# Altium footprint library Módulos y Tarjetas.PcbLib: 18 footprints (part 1 of 2)
Each footprint in its own frame and in the unit in brackets; x right, y up, seen from the top. Pads: shape width x height; smd on the part's side, far side on the other; paste and mask are expansions set on the pad; w line width, h text height; cw(c..) or ccw(c..) is an arc to the next point about the centre after c.
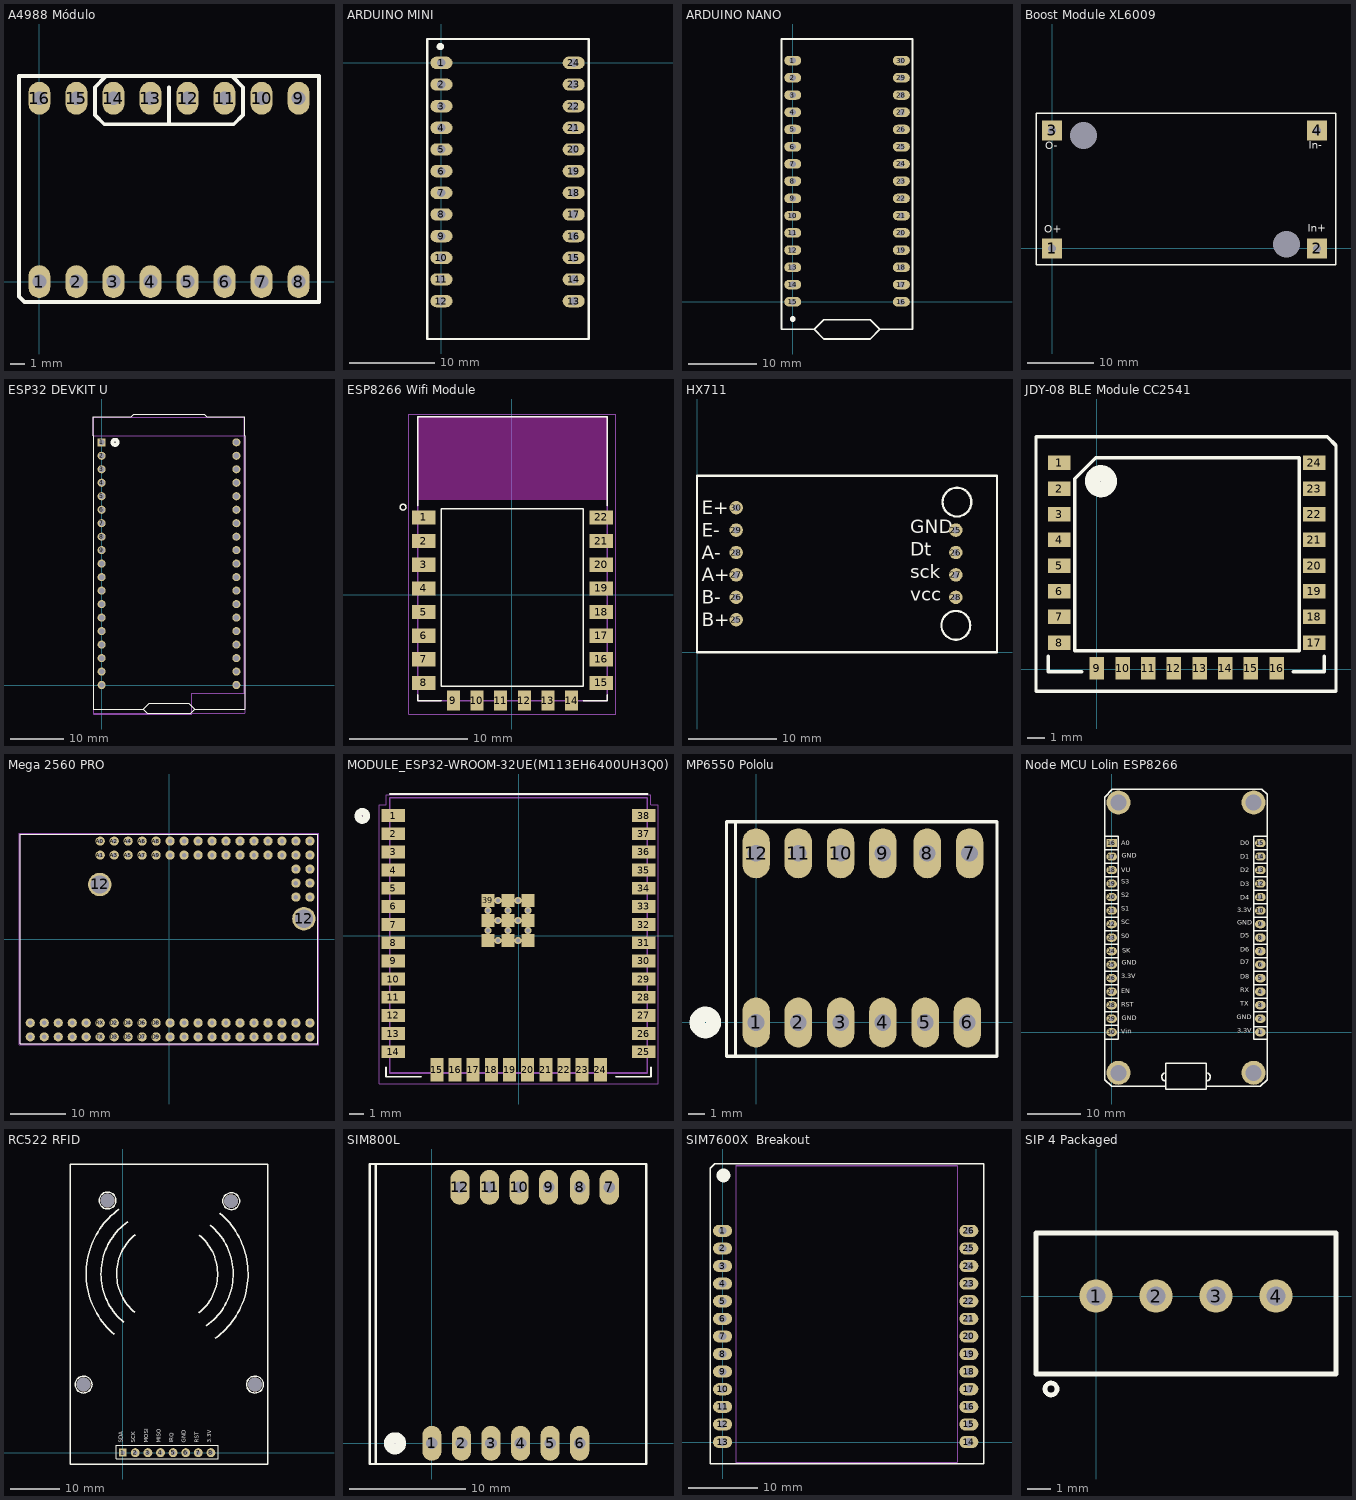
[diagram p0: the footprints below, top view; thin cyan lines are the x and y axes]

## A4988 Módulo [mm] "Stepper Module A4988"
pads (16):
  oval 1.5x2.25 hole 0.95: 1(0,0) 2(2.54,0) 3(5.08,0) 4(7.62,0) 5(10.16,0) 6(12.7,0) 7(15.24,0) 8(17.78,0) 9(17.78,12.573) 10(15.24,12.573) 11(12.7,12.573) 12(10.16,12.573) 13(7.62,12.573) 14(5.08,12.573) 15(2.54,12.573) 16(0,12.573)
Top Overlay:
  lines w0.254: 4.572,14.097 3.81,13.335 3.81,11.43 4.445,10.795 13.335,10.795 13.97,11.43 13.97,13.335 13.208,14.097 ; 8.89,10.795 8.89,13.335 ; -1.397,-1.016 -1.397,14.097 19.177,14.097 19.177,-1.397 -1.016,-1.397 -1.397,-1.016
3D body "A4988.step": height 6.54, standoff -3.62, extent -1.27,-1.27 19.05,13.97

## ARDUINO MINI [mm] "ARDUINO MINI"
pads (24):
  oval 2.6x1.45 hole 1: 1(0,0) 2(0,-2.54) 3(0,-5.08) 4(0,-7.62) 5(0,-10.16) 6(0,-12.7) 7(0,-15.24) 8(0,-17.78) 9(0,-20.32) 10(0,-22.86) 11(0,-25.4) 12(0,-27.94) 13(15.508,-27.94) 14(15.508,-25.4) 15(15.508,-22.86) 16(15.508,-20.32) 17(15.508,-17.78) 18(15.508,-15.24) 19(15.508,-12.7) 20(15.508,-10.16) 21(15.508,-7.62) 22(15.508,-5.08) 23(15.508,-2.54) 24(15.508,0)
Top Overlay:
  circle w0.5: c-0.127,1.905 r0.18
  lines w0.254: -1.651,-32.385 -1.651,2.794 17.272,2.794 17.272,-32.385 -1.651,-32.385
3D body "Arduino Pro Mini v7 headers.step": height 9, standoff -3.2, extent -1.153,-32.131 16.647,1.187

## ARDUINO NANO [mm] "ARDUINO NANO"
pads (30):
  oval 2.5x1.4 hole 0.9: 1(0,35.56) 2(0,33.02) 3(0,30.48) 4(0,27.94) 5(0,25.4) 6(0,22.86) 7(0,20.32) 8(0,17.78) 9(0,15.24) 10(0,12.7) 11(0,10.16) 12(0,7.62) 13(0,5.08) 14(0,2.54) 15(0,0) 16(16.016,0) 17(16.016,2.54) 18(16.016,5.08) 19(16.016,7.62) 20(16.016,10.16) 21(16.016,12.7) 22(16.016,15.24) 23(16.016,17.78) 24(16.016,20.32) 25(16.016,22.86) 26(16.016,25.4) 27(16.016,27.94) 28(16.016,30.48) 29(16.016,33.02) 30(16.016,35.56)
Top Overlay:
  circle w0.5: c0,-2.54 r0.18
  lines w0.254: 3.175,-4.064 4.593,-5.482 11.409,-5.482 12.827,-4.064 ; 3.175,-4.064 -1.651,-4.064 -1.651,38.735 17.653,38.735 17.653,-4.064 12.827,-4.064 ; 3.175,-4.064 4.593,-2.646 11.409,-2.646 12.827,-4.064
3D body "Arduino Nano.STEP": height 22.1, standoff 3.5, extent -1.075,-5.482 16.925,39.518
3D body "HH15X1.stp": height 8.5, standoff -3.2, extent -1.25,-1.395 1.25,36.955
3D body "HH15X1.stp": height 8.5, standoff -3.2, extent 14.752,-1.395 17.252,36.955

## Boost Module XL6009 [mm] "Boost Converter DC-DC"
pads (6):
  rect 3x3 hole 1.2: 1(0,0) 2(39.6,0) 3(0,17.653) 4(39.6,17.653)
  round 1.524 hole 4: ""(4.699,16.891) ""(35.032,0.635)
Top Overlay:
  lines w0.2: -2.413,-2.413 42.418,-2.413 42.418,20.193 -2.413,20.193 -2.413,-2.413
  text "O+" at -1.143,1.905 h2
  text "O-" at -1.016,14.351 h2
  text "In-" at 38.354,14.478 h2
  text "In+" at 38.227,2.032 h2
3D body "DC-DC XL6009E1 (STEP AP214).STEP": height 14.05, standoff 0.3, extent -1.651,-1.651 41.649,19.449

## ESP32 DEVKIT U [mm]
pads (38):
  rect 1.53x1.53 hole 1.02: 1(0,45.72)
  round 1.53 hole 1.02: 2(0,43.18) 3(0,40.64) 4(0,38.1) 5(0,35.56) 6(0,33.02) 7(0,30.48) 8(0,27.94) 9(0,25.4) 10(0,22.86) 11(0,20.32) 12(0,17.78) 13(0,15.24) 14(0,12.7) 15(0,10.16) 16(0,7.62) 17(0,5.08) 18(0,2.54) 19(0,0) 20(25.4,0) 21(25.4,2.54) 22(25.4,5.08) 23(25.4,7.62) 24(25.4,10.16) 25(25.4,12.7) 26(25.4,15.24) 27(25.4,17.78) 28(25.4,20.32) 29(25.4,22.86) 30(25.4,25.4) 31(25.4,27.94) 32(25.4,30.48) 33(25.4,33.02) 34(25.4,35.56) 35(25.4,38.1) 36(25.4,40.64) 37(25.4,43.18) 38(25.4,45.72)
Top Overlay:
  circle w0.7: c2.54,45.72 r0.5
  lines w0.1: 7.868,-4.572 7.874,-4.572 ; 16.383,-3.429 17.522,-4.568 17.522,-4.572
  lines w0.127: 7.874,-4.572 9.017,-3.429 16.383,-3.429 ; -1.524,-4.572 7.868,-4.572 8.63,-5.334 16.76,-5.334 17.522,-4.572 26.924,-4.572 26.924,46.97 26.924,50.546 19.812,50.546 19.304,51.054 6.096,51.054 5.588,50.546 -1.524,50.546 -1.524,46.97 -1.524,-4.572
Mechanical 13:
  lines w0.127: 3.7,46.97 -1.524,46.97 ; -1.524,46.97 -1.524,50.419 26.924,50.419 26.924,46.97 ; -1.524,46.97 26.924,46.97 ; -1.524,46.97 -1.524,-5.334 8.63,-5.334 16.76,-5.334 26.924,-5.334 26.924,46.97
Mechanical 15:
  lines w0.05: -1.5,-5.461 8.38,-5.461 17.01,-5.461 17.01,-1.51 26.9,-1.51 26.9,47.25 26.9,50.419 -1.5,50.419 -1.5,47.25 -1.5,-5.461
3D body "ESP32 Development Board.STEP": height 16.6, standoff 3.46, extent -1.27,-5.334 26.67,50.246
3D body "Female Header 19x1 2.54.step": height 8.5, standoff -3.2, extent -1.27,-1.27 1.27,46.99
3D body "Female Header 19x1 2.54.step": height 8.5, standoff -3.2, extent 24.13,-1.27 26.67,46.99

## ESP8266 Wifi Module [mm] "ESP12E Model"
pads (22):
  rect 2x1.2 smd: 1(-7.454,6.532) 2(-7.454,4.532) 3(-7.454,2.532) 4(-7.454,0.532) 5(-7.454,-1.468) 6(-7.454,-3.468) 7(-7.454,-5.468) 8(-7.454,-7.468) 15(7.546,-7.468) 16(7.546,-5.468) 17(7.546,-3.468) 18(7.546,-1.468) 19(7.546,0.532) 20(7.546,2.532) 21(7.546,4.532) 22(7.546,6.532)
  rect 1.1x1.7 smd: 9(-4.954,-8.968) 10(-2.954,-8.968) 11(-0.954,-8.968) 12(1.046,-8.968) 13(3.046,-8.968) 14(5.046,-8.968)
Top Overlay:
  circle w0.127: c-9.204,7.407 r0.25
  lines w0.127: -7.954,-8.468 -7.954,-8.968 -5.954,-8.968 ; -7.954,7.532 -7.954,15.032 8.046,15.032 8.046,7.532 ; 6.046,-8.968 8.046,-8.968 8.046,-8.468 ; -5.954,-7.728 -5.954,7.272 6.046,7.272 6.046,-7.728 -5.954,-7.728
Keep-Out Layer:
  region: 8.046,8.041 -7.963,8.041 -7.963,15.032 8.046,15.032
  region: 8.046,8.041 -7.963,8.041 -7.963,15.032 8.046,15.032
Mechanical 13:
  lines w0.127: -7.954,-8.968 -7.954,15.032 8.046,15.032 8.046,-8.968 -7.954,-8.968
Mechanical 15:
  lines w0.05: -8.704,-10.093 -8.704,15.282 8.796,15.282 8.796,-10.093 -8.704,-10.093
3D body "ESP8266 ESP-12E-1.step": height 2.65, standoff -0.04, extent -8.005,-8.957 8.005,15.048

## HX711 [mil] "módulo convertidor analógico-digital (ADC) de 24 bits de alta precisión"
pads (10):
  round 60 hole 30: 25(175,145) 25(1155,545) 26(175,245) 26(1155,445) 27(175,345) 27(1155,345) 28(175,445) 28(1155,245) 29(175,545) 30(175,645)
Top Overlay:
  circle w10: c1155,120 r64.17
  circle w10: c1160,670 r64.17
  lines w10: 0,0 0,787.4 1338.58,787.4 1338.58,0 0,0
  text "E+" at 21.37,615.76 h60
  text "E-" at 21.37,515.76 h60
  text "A-" at 21.37,415.76 h60
  text "A+" at 21.37,315.76 h60
  text "B-" at 21.37,215.76 h60
  text "B+" at 21.37,115.76 h60
  text "GND" at 951.37,530.76 h60
  text "Dt" at 951.37,430.76 h60
  text "sck" at 951.37,330.76 h60
  text "vcc" at 951.37,230.76 h60

## JDY-08 BLE Module CC2541 [mm]
pads (24):
  rect 1.3x0.85 smd: 1(-2.2,12.065) 2(-2.2,10.565) 3(-2.2,9.065) 4(-2.2,7.565) 5(-2.2,6.065) 6(-2.2,4.565) 7(-2.2,3.065) 8(-2.2,1.565) 17(12.7,1.565) 18(12.7,3.065) 19(12.7,4.565) 20(12.7,6.065) 21(12.7,7.565) 22(12.7,9.065) 23(12.7,10.565) 24(12.7,12.065)
  rect 0.85x1.3 smd: 9(0,0.065) 10(1.5,0.065) 11(3,0.065) 12(4.5,0.065) 13(6,0.065) 14(7.5,0.065) 15(9,0.065) 16(10.5,0.065)
Top Overlay:
  lines w0.203: -2.835,0.763 -2.835,-0.127 -0.889,-0.127 ; 11.465,-0.127 13.294,-0.127 13.294,0.763 ; -3.556,-1.27 -3.556,0.01 -3.556,13.589 13.462,13.589 13.97,13.081 13.97,-1.27 -3.556,-1.27 ; -1.286,1.092 -1.286,11.151 -0.066,12.37 11.821,12.37 11.821,1.092 -1.286,1.092
  lines w0.914: -0.244,10.998 ccw(c0.238,10.998) -0.243,11.009
3D body "JDY-08.stp": height 2.08, standoff 0, extent -2.299,0.127 12.713,20.015

## Mega 2560 PRO [mm] "Arduino Mega 2560 PRO"
pads (82):
  round 1.676 hole 0.8: 3V3_1(-17.58,-17.78) 3V3_2(-17.58,-15.24) 5V_1(-20.12,-17.78) 5V_2(-20.12,-15.24) A0(-12.5,17.78) A1(-12.5,15.24) A2(-9.96,17.78) A3(-9.96,15.24) A4(-7.42,17.78) A5(-7.42,15.24) A6(-4.88,17.78) A7(-4.88,15.24) A8(-2.34,17.78) A9(-2.34,15.24) A10(0.2,17.78) A11(0.2,15.24) A12(2.74,17.78) A13(2.74,15.24) A14(5.28,17.78) A15(5.28,15.24) AREF(-15.04,-15.24) D2(-9.96,-15.24) D3(-9.96,-17.78) D4(-7.42,-15.24) D5(-7.42,-17.78) D6(-4.88,-15.24) D7(-4.88,-17.78) D8(-2.34,-15.24) D9(-2.34,-17.78) D10(0.2,-15.24) D11(0.2,-17.78) D12(2.74,-15.24) D13(2.74,-17.78) D14(5.28,-15.24) D15(5.28,-17.78) D16(7.82,-15.24) D17(7.82,-17.78) D18(10.36,-15.24) D19(10.36,-17.78) D20(12.9,-15.24) D21(12.9,-17.78) D22(15.44,-15.24) D23(15.44,-17.78) D24(17.98,-15.24) D25(17.98,-17.78) D26(20.52,-15.24) D27(20.52,-17.78) D28(23.06,-15.24) D29(23.06,-17.78) D30(25.6,-15.24) D31(25.6,-17.78) D32(7.82,17.78) D33(7.82,15.24) D34(10.36,17.78) D35(10.36,15.24) D36(12.9,17.78) D37(12.9,15.24) D38(15.44,17.78) D39(15.44,15.24) D40(17.98,17.78) D41(17.98,15.24) D42(20.52,17.78) D43(20.52,15.24) D44(23.06,17.78) D45(23.06,15.24) D46(25.6,17.78) D47(25.6,15.24) D48(25.6,12.7) D49(23.06,12.7) D50(25.6,10.16) D51(23.06,10.16) D52(25.6,7.62) D53(23.06,7.62) GND_1(-22.66,-17.78) GND_2(-22.66,-15.24) RST(-15.04,-17.78) RX(-12.5,-15.24) TX(-12.5,-17.78) VIN_1(-25.2,-17.78) VIN_2(-25.2,-15.24)
  round 4.25 hole 3.3: 12(-12.573,9.906) 12(24.511,3.683)
Top Overlay:
  lines w0.127: -27,-19 -27,19 27,19 27,-19 -27,-19
Mechanical 13:
  lines w0.127: -27,-19 -27,19 27,19 27,-19 -27,-19
Mechanical 15:
  lines w0.05: -27.25,-19.25 27.25,-19.25 27.25,19.25 -27.25,19.25 -27.25,-19.25
3D body "HH2x1.step": height 8.5, standoff -3.2, extent -26.47,-19.075 -23.93,-13.995
3D body "HH3X1.stp": height 8.5, standoff -3.2, extent 21.81,6.225 24.31,14.095
3D body "HH3X1.stp": height 8.5, standoff -3.2, extent 24.35,6.225 26.85,14.095
3D body "HH20X1.stp": height 8.5, standoff -3.2, extent -23.926,-19.03 27.124,-16.53
3D body "HH20X1.stp": height 8.5, standoff -3.2, extent -23.926,-16.49 27.124,-13.99
3D body "Header_Male_1Pin.STEP": height 21.34, standoff 9.8, extent 24.33,-3.785 26.87,-1.295
3D body "Header_Male_1Pin.STEP": height 14, standoff 2.46, extent 21.79,11.455 24.33,13.945
3D body "Header_Male_1Pin.STEP": height 14, standoff 2.46, extent 21.79,8.915 24.33,11.405
3D body "Header_Male_1Pin.STEP": height 14, standoff 2.46, extent 24.33,11.455 26.87,13.945
3D body "Header_Male_1Pin.STEP": height 21.34, standoff 9.8, extent 24.33,-1.245 26.87,1.245
3D body "Header_Male_1Pin.STEP": height 21.34, standoff 9.8, extent 21.79,-1.245 24.33,1.245
3D body "Header_Male_1Pin.STEP": height 14, standoff 2.46, extent -18.85,-16.485 -16.31,-13.995
3D body "Header_Male_1Pin.STEP": height 14, standoff 2.46, extent -26.47,-16.485 -23.93,-13.995
3D body "Header_Male_1Pin.STEP": height 14, standoff 2.46, extent -21.39,-16.485 -18.85,-13.995
3D body "Header_Male_1Pin.STEP": height 14, standoff 2.46, extent -23.93,-16.485 -21.39,-13.995
3D body "Header_Male_1Pin.STEP": height 14, standoff 2.46, extent -16.31,-16.485 -13.77,-13.995
3D body "Header_Male_1Pin.STEP": height 14, standoff 2.46, extent -16.31,-19.025 -13.77,-16.535
3D body "Header_Male_1Pin.STEP": height 14, standoff 2.46, extent -23.93,-19.025 -21.39,-16.535
3D body "Header_Male_1Pin.STEP": height 14, standoff 2.46, extent -21.39,-19.025 -18.85,-16.535
3D body "Header_Male_1Pin.STEP": height 14, standoff 2.46, extent -26.47,-19.025 -23.93,-16.535
3D body "Header_Male_1Pin.STEP": height 14, standoff 2.46, extent -18.85,-19.025 -16.31,-16.535
3D body "Header_Male_1Pin.STEP": height 21.34, standoff 9.8, extent 24.33,-6.325 26.87,-3.835
3D body "Header_Male_1Pin.STEP": height 21.34, standoff 9.8, extent 21.79,-3.785 24.33,-1.295
3D body "Header_Male_1Pin.STEP": height 14, standoff 2.46, extent 21.79,6.375 24.33,8.865
3D body "Header_Male_1Pin.STEP": height 14, standoff 2.46, extent 24.33,6.375 26.87,8.865
3D body "Header_Male_1Pin.STEP": height 14, standoff 2.46, extent 24.33,8.915 26.87,11.405
3D body "Header_Male_1Pin.STEP": height 21.34, standoff 9.8, extent 21.79,-6.325 24.33,-3.835
3D body "Header_Male_1Pin.STEP": height 14, standoff 2.46, extent -6.15,-16.485 -3.61,-13.995
3D body "Header_Male_1Pin.STEP": height 14, standoff 2.46, extent -13.77,-16.485 -11.23,-13.995
3D body "Header_Male_1Pin.STEP": height 14, standoff 2.46, extent -8.69,-16.485 -6.15,-13.995
3D body "Header_Male_1Pin.STEP": height 14, standoff 2.46, extent -11.23,-16.485 -8.69,-13.995
3D body "Header_Male_1Pin.STEP": height 14, standoff 2.46, extent 9.09,-16.485 11.63,-13.995
3D body "Header_Male_1Pin.STEP": height 14, standoff 2.46, extent 1.47,-16.485 4.01,-13.995
3D body "Header_Male_1Pin.STEP": height 14, standoff 2.46, extent 4.01,-16.485 6.55,-13.995
3D body "Header_Male_1Pin.STEP": height 14, standoff 2.46, extent -1.07,-16.485 1.47,-13.995
3D body "Header_Male_1Pin.STEP": height 14, standoff 2.46, extent 6.55,-16.485 9.09,-13.995
3D body "Header_Male_1Pin.STEP": height 14, standoff 2.46, extent -3.61,-16.485 -1.07,-13.995
3D body "Header_Male_1Pin.STEP": height 14, standoff 2.46, extent 11.63,-16.485 14.17,-13.995
3D body "Header_Male_1Pin.STEP": height 14, standoff 2.46, extent 21.79,-16.485 24.33,-13.995
3D body "Header_Male_1Pin.STEP": height 14, standoff 2.46, extent 14.17,-16.485 16.71,-13.995
3D body "Header_Male_1Pin.STEP": height 14, standoff 2.46, extent 19.25,-16.485 21.79,-13.995
3D body "Header_Male_1Pin.STEP": height 14, standoff 2.46, extent 16.71,-16.485 19.25,-13.995
3D body "Header_Male_1Pin.STEP": height 14, standoff 2.46, extent 24.33,-16.485 26.87,-13.995
3D body "Header_Male_1Pin.STEP": height 14, standoff 2.46, extent 24.33,-19.025 26.87,-16.535
3D body "Header_Male_1Pin.STEP": height 14, standoff 2.46, extent 16.71,-19.025 19.25,-16.535
3D body "Header_Male_1Pin.STEP": height 14, standoff 2.46, extent 19.25,-19.025 21.79,-16.535
3D body "Header_Male_1Pin.STEP": height 14, standoff 2.46, extent 14.17,-19.025 16.71,-16.535
3D body "Header_Male_1Pin.STEP": height 14, standoff 2.46, extent 21.79,-19.025 24.33,-16.535
3D body "Header_Male_1Pin.STEP": height 14, standoff 2.46, extent 11.63,-19.025 14.17,-16.535
3D body "Header_Male_1Pin.STEP": height 14, standoff 2.46, extent -3.61,-19.025 -1.07,-16.535
3D body "Header_Male_1Pin.STEP": height 14, standoff 2.46, extent 6.55,-19.025 9.09,-16.535
3D body "Header_Male_1Pin.STEP": height 14, standoff 2.46, extent -1.07,-19.025 1.47,-16.535
3D body "Header_Male_1Pin.STEP": height 14, standoff 2.46, extent 4.01,-19.025 6.55,-16.535
3D body "Header_Male_1Pin.STEP": height 14, standoff 2.46, extent 1.47,-19.025 4.01,-16.535
3D body "Header_Male_1Pin.STEP": height 14, standoff 2.46, extent 9.09,-19.025 11.63,-16.535
3D body "Header_Male_1Pin.STEP": height 14, standoff 2.46, extent -11.23,-19.025 -8.69,-16.535
3D body "Header_Male_1Pin.STEP": height 14, standoff 2.46, extent -8.69,-19.025 -6.15,-16.535
3D body "Header_Male_1Pin.STEP": height 14, standoff 2.46, extent -13.77,-19.025 -11.23,-16.535
3D body "Header_Male_1Pin.STEP": height 14, standoff 2.46, extent -6.15,-19.025 -3.61,-16.535
3D body "Header_Male_1Pin.STEP": height 14, standoff 2.46, extent -6.15,13.868 -3.61,16.358
3D body "Header_Male_1Pin.STEP": height 14, standoff 2.46, extent -13.77,13.868 -11.23,16.358
3D body "Header_Male_1Pin.STEP": height 14, standoff 2.46, extent -8.69,13.868 -6.15,16.358
3D body "Header_Male_1Pin.STEP": height 14, standoff 2.46, extent -11.23,13.868 -8.69,16.358
3D body "Header_Male_1Pin.STEP": height 14, standoff 2.46, extent 9.09,13.868 11.63,16.358
3D body "Header_Male_1Pin.STEP": height 14, standoff 2.46, extent 1.47,13.868 4.01,16.358
3D body "Header_Male_1Pin.STEP": height 14, standoff 2.46, extent 4.01,13.868 6.55,16.358
3D body "Header_Male_1Pin.STEP": height 14, standoff 2.46, extent -1.07,13.868 1.47,16.358
3D body "Header_Male_1Pin.STEP": height 14, standoff 2.46, extent 6.55,13.868 9.09,16.358
3D body "Header_Male_1Pin.STEP": height 14, standoff 2.46, extent -3.61,13.868 -1.07,16.358
3D body "Header_Male_1Pin.STEP": height 14, standoff 2.46, extent 11.63,13.868 14.17,16.358
3D body "Header_Male_1Pin.STEP": height 14, standoff 2.46, extent 21.79,13.868 24.33,16.358
3D body "Header_Male_1Pin.STEP": height 14, standoff 2.46, extent 14.17,13.868 16.71,16.358
3D body "Header_Male_1Pin.STEP": height 14, standoff 2.46, extent 19.25,13.868 21.79,16.358
3D body "Header_Male_1Pin.STEP": height 14, standoff 2.46, extent 16.71,13.868 19.25,16.358
3D body "Header_Male_1Pin.STEP": height 14, standoff 2.46, extent 24.33,13.868 26.87,16.358
3D body "MEGA 2560 PRO (EMBED).stp": height 17.14, standoff 11.17, extent -27.084,-19.127 27,18.873
3D body "HH16X1.stp": height 8.5, standoff -3.2, extent -13.895,16.53 26.995,19.03
3D body "HH16X1.stp": height 8.5, standoff -3.2, extent -13.895,13.99 26.995,16.49
3D body "Header_Male_1Pin.STEP": height 14, standoff 2.46, extent 24.33,16.408 26.87,18.898
3D body "Header_Male_1Pin.STEP": height 14, standoff 2.46, extent 16.71,16.408 19.25,18.898
3D body "Header_Male_1Pin.STEP": height 14, standoff 2.46, extent 19.25,16.408 21.79,18.898
3D body "Header_Male_1Pin.STEP": height 14, standoff 2.46, extent 14.17,16.408 16.71,18.898
3D body "Header_Male_1Pin.STEP": height 14, standoff 2.46, extent 21.79,16.408 24.33,18.898
3D body "Header_Male_1Pin.STEP": height 14, standoff 2.46, extent 11.63,16.408 14.17,18.898
3D body "Header_Male_1Pin.STEP": height 14, standoff 2.46, extent -3.61,16.408 -1.07,18.898
3D body "Header_Male_1Pin.STEP": height 14, standoff 2.46, extent 6.55,16.408 9.09,18.898
3D body "Header_Male_1Pin.STEP": height 14, standoff 2.46, extent -1.07,16.408 1.47,18.898
3D body "Header_Male_1Pin.STEP": height 14, standoff 2.46, extent 4.01,16.408 6.55,18.898
3D body "Header_Male_1Pin.STEP": height 14, standoff 2.46, extent 1.47,16.408 4.01,18.898
3D body "Header_Male_1Pin.STEP": height 14, standoff 2.46, extent 9.09,16.408 11.63,18.898
3D body "Header_Male_1Pin.STEP": height 14, standoff 2.46, extent -11.23,16.408 -8.69,18.898
3D body "Header_Male_1Pin.STEP": height 14, standoff 2.46, extent -8.69,16.408 -6.15,18.898
3D body "Header_Male_1Pin.STEP": height 14, standoff 2.46, extent -13.77,16.408 -11.23,18.898
3D body "Header_Male_1Pin.STEP": height 14, standoff 2.46, extent -6.15,16.408 -3.61,18.898

## MODULE_ESP32-WROOM-32UE(M113EH6400UH3Q0) [mm]
pads (59):
  rect 1.65x0.9 smd: 1(-8.75,8.41) 2(-8.75,7.14) 3(-8.75,5.87) 4(-8.75,4.6) 5(-8.75,3.33) 6(-8.75,2.06) 7(-8.75,0.79) 8(-8.75,-0.48) 9(-8.75,-1.75) 10(-8.75,-3.02) 11(-8.75,-4.29) 12(-8.75,-5.56) 13(-8.75,-6.83) 14(-8.75,-8.1) 25(8.75,-8.1) 26(8.75,-6.83) 27(8.75,-5.56) 28(8.75,-4.29) 29(8.75,-3.02) 30(8.75,-1.75) 31(8.75,-0.48) 32(8.75,0.79) 33(8.75,2.06) 34(8.75,3.33) 35(8.75,4.6) 36(8.75,5.87) 37(8.75,7.14) 38(8.75,8.41)
  rect 0.9x1.65 smd: 15(-5.71,-9.35) 16(-4.44,-9.35) 17(-3.17,-9.35) 18(-1.9,-9.35) 19(-0.63,-9.35) 20(0.64,-9.35) 21(1.91,-9.35) 22(3.18,-9.35) 23(4.45,-9.35) 24(5.72,-9.35)
  rect 0.9x0.9 smd: 39(-2.138,2.47) 39_2(-0.738,2.47) 39_3(0.662,2.47) 39_4(-2.138,1.07) 39_5(-0.738,1.07) 39_6(0.662,1.07) 39_7(-2.138,-0.33) 39_8(-0.738,-0.33) 39_9(0.662,-0.33)
  round 0.5 hole 0.3: 39_10(-1.438,2.47) 39_11(-0.038,2.47) 39_12(-2.138,1.77) 39_13(-0.738,1.77) 39_14(0.662,1.77) 39_15(-1.438,1.07) 39_16(-0.038,1.07) 39_17(-2.138,0.37) 39_18(-0.738,0.37) 39_19(0.662,0.37) 39_20(-1.438,-0.33) 39_21(-0.038,-0.33)
Top Overlay:
  circle w0.5: c-10.922,8.382 r0.3
  lines w0.127: -9.254,-9.204 -9.254,-9.854 -6.804,-9.854 ; -8.983,9.906 9.017,9.906 ; 6.804,-9.854 9.254,-9.854 9.254,-9.204
Mechanical 13:
  circle w0.3: c-10.922,8.382 r0.2
  lines w0.127: -9,-9.6 -9,9.652 9,9.652 9,-9.6 -9,-9.6
Mechanical 15:
  lines w0.05: -9.75,-10.35 -9.75,9.15 -9.25,9.15 -9.25,9.85 9.25,9.85 9.25,9.15 9.75,9.15 9.75,-10.35 -9.75,-10.35
3D body "ESp32-WROOM-32U v3.step": height 3.4, standoff -0.04, extent -9.053,-9.62 9.017,9.62

## MP6550 Pololu [mm] "MP6550 Single Brushed DC Motor Driver Carrier"
pads (12):
  oval 1.65x3 hole 1: 1(0,0) 2(2.54,0) 3(5.08,0) 4(7.62,0) 5(10.16,0) 6(12.7,0) 7(12.827,10.16) 8(10.287,10.16) 9(7.62,10.16) 10(5.08,10.16) 11(2.54,10.16) 12(0,10.16)
Top Overlay:
  circle w0.9: c-3.048,0 r0.5
  lines w0.2: -1.232,-2.036 -1.232,12.061 ; -1.778,-2.032 -1.778,12.065 14.478,12.065 14.478,-2.032 -1.778,-2.032
3D body "Header_Male_1Pin.STEP": height 9.5, standoff -2.04, extent 8.964,-1.138 11.504,1.352
3D body "Header_Male_1Pin.STEP": height 9.5, standoff -2.04, extent 1.217,-1.138 3.757,1.352
3D body "Header_Male_1Pin.STEP": height 9.5, standoff -2.04, extent -1.323,-1.138 1.217,1.352
3D body "Header_Male_1Pin.STEP": height 9.5, standoff -2.04, extent 3.757,-1.138 6.297,1.352
3D body "Header_Male_1Pin.STEP": height 9.5, standoff -2.04, extent 6.297,-1.138 8.837,1.352
3D body "Header_Male_1Pin.STEP": height 9.5, standoff -2.04, extent 11.504,-1.138 14.044,1.352
3D body "Header_Male_1Pin.STEP": height 9.5, standoff -2.04, extent 9.017,8.915 11.557,11.405
3D body "Header_Male_1Pin.STEP": height 9.5, standoff -2.04, extent 1.27,8.915 3.81,11.405
3D body "Header_Male_1Pin.STEP": height 9.5, standoff -2.04, extent -1.27,8.915 1.27,11.405
3D body "Header_Male_1Pin.STEP": height 9.5, standoff -2.04, extent 3.81,8.915 6.35,11.405
3D body "Header_Male_1Pin.STEP": height 9.5, standoff -2.04, extent 6.35,8.915 8.89,11.405
3D body "Header_Male_1Pin.STEP": height 9.5, standoff -2.04, extent 11.557,8.915 14.097,11.405
3D body "mp6550-single-brushed-dc-motor-driver-carrier.step": height 8.87, standoff 6.5, extent -1.27,-1.27 13.97,11.43

## Node MCU Lolin ESP8266 [mm] "Node MCU ESP8266 Embbebed 30 Pin Module"
pads (34):
  oval 2x1.55 hole 0.9: 1(27.94,0) 2(27.94,2.54) 3(27.94,5.08) 4(27.94,7.62) 5(27.94,10.16) 6(27.94,12.7) 7(27.94,15.24) 8(27.94,17.78) 9(27.94,20.32) 10(27.94,22.86) 11(27.94,25.4) 12(27.94,27.94) 13(27.94,30.48) 14(27.94,33.02) 15(27.94,35.56) 17(0,33.02) 18(0,30.48) 19(0,27.94) 20(0,25.4) 21(0,22.86) 22(0,20.32) 23(0,17.78) 24(0,15.24) 25(0,12.7) 26(0,10.16) 27(0,7.62) 28(0,5.08) 29(0,2.54) 30(0,0)
  rect 2x1.55 hole 0.9: 16(0,35.56)
  round 4.5 hole 3: ""(1.27,-7.62) ""(1.27,43.18) ""(26.67,-7.62) ""(26.67,43.18)
Top Overlay:
  circle w0.254: c1.27,43.18 r1.27
  circle w0.254: c26.67,43.18 r1.27
  circle w0.254: c26.67,-7.62 r1.27
  circle w0.254: c1.27,-7.62 r1.27
  lines w0.254: -1.27,1.27 1.27,1.27 ; -1.27,3.81 1.27,3.81 ; -1.27,6.35 1.27,6.35 ; -1.27,8.89 1.27,8.89 ; -1.27,11.43 1.27,11.43 ; -1.27,13.97 1.27,13.97 ; -1.27,16.51 1.27,16.51 ; -1.27,19.05 1.27,19.05 ; -1.27,21.59 1.27,21.59 ; -1.27,24.13 1.27,24.13 ; -1.27,26.67 1.27,26.67 ; -1.27,29.21 1.27,29.21 ; -1.27,31.75 1.27,31.75 ; -1.27,34.29 1.27,34.29 ; -1.27,43.434 -1.27,44.196 0.086,45.72 6.35,45.72 21.59,45.72 28.194,45.72 29.21,44.704 29.21,-8.89 27.94,-10.16 17.78,-10.16 ; -1.27,43.942 -1.27,36.83 ; 10.16,-9.144 cw(c10.16,-8.382) 10.16,-7.62 ; 17.78,-9.144 ccw(c17.78,-8.382) 17.78,-7.62 ; 26.67,1.016 29.21,1.016 ; 26.67,3.81 29.21,3.81 ; 26.67,6.35 29.21,6.35 ; 26.67,8.89 29.21,8.89 ; 26.67,11.43 29.21,11.43 ; 26.67,13.97 29.21,13.97 ; 26.67,16.51 29.21,16.51 ; 26.67,19.05 29.21,19.05 ; 26.67,21.59 29.21,21.59 ; 26.67,24.13 29.21,24.13 ; 26.67,26.67 29.21,26.67 ; 26.67,29.21 29.21,29.21 ; 26.67,31.75 29.21,31.75 ; 26.67,34.29 29.21,34.29 ; 29.21,-1.27 26.67,-1.27 26.67,36.83 29.21,36.83 ; -1.27,-1.27 -1.27,36.83 ; -1.27,-1.27 -1.27,-8.89 0,-10.16 10.16,-10.16 ; -1.27,-1.27 1.27,-1.27 1.27,36.83 -1.27,36.83 ; 10.16,-10.16 10.16,-5.842 17.78,-5.842 17.78,-10.16 ; 10.16,-10.16 10.16,-10.668 17.78,-10.668 17.78,-10.16
  text "D0" at 24.13,34.74 h1.5
  text "D1" at 24.13,32.2 h1.5
  text "D2" at 24.13,29.66 h1.5
  text "D3" at 24.13,27.051 h1.5
  text "D4" at 24.13,24.511 h1.5
  text "3.3V" at 23.622,22.225 h1.5
  text "GND" at 23.622,19.812 h1.5
  text "D5" at 24.13,17.341 h1.5
  text "D6" at 24.13,14.801 h1.5
  text "D7" at 24.13,12.446 h1.5
  text "D8" at 24.13,9.721 h1.5
  text "RX" at 24.13,7.181 h1.5
  text "TX" at 24.13,4.641 h1.5
  text "GND" at 23.495,2.032 h1.5
  text "3.3V" at 23.622,-0.439 h1.5
  text "Vin" at 1.8,-0.635 h1.5
  text "GND" at 1.905,1.905 h1.5
  text "RST" at 1.778,4.445 h1.5
  text "EN" at 1.778,6.985 h1.5
  text "3.3V" at 1.778,9.779 h1.5
  text "GND" at 1.905,12.319 h1.5
  text "SK" at 2.032,14.605 h1.5
  text "S0" at 1.778,17.272 h1.5
  text "SC" at 1.778,19.939 h1.5
  text "S1" at 1.778,22.479 h1.5
  text "S2" at 1.778,24.961 h1.5
  text "S3" at 1.778,27.501 h1.5
  text "VU" at 1.778,29.66 h1.5
  text "GND" at 1.905,32.385 h1.5
  text "A0" at 1.778,34.74 h1.5
3D body "HH15X1.stp": height 8.7, standoff -3, extent 26.69,-1.395 29.19,36.955
3D body "HH15X1.stp": height 8.7, standoff -3, extent -1.377,-1.395 1.123,36.955
3D body "Lolin NodeMCU ESP8266 V3.step": height 16.35, standoff 3.21, extent -1.778,-13.099 29.722,46.881

## RC522 RFID [mil] "RFID MODULE SPI/I2C"
pads (12):
  rect 62x62 hole 35: 1(0,0)
  round 70.87 hole 35: 2(100,0) 3(200,0) 4(300,0) 5(400,0) 6(500,0) 7(600,0) 8(700,0)
  round 110 hole 110 unplated: ""(-310,540) ""(-120,2000) ""(860,1995) ""(1050,540)
Top Overlay:
  circle w10: c861,1995.1 r66.93
  circle w10: c-310,540 r66.93
  circle w10: c1050,540 r66.93
  circle w10: c-120,2000 r66.93
  lines w8: -50,-50 760,-50 760,60 -50,60 -50,-50
  lines w10: -66.99,939.01 cw(c340,1420) -30,1930 ; 9.31,1033.53 cw(c330,1420) 40,1830 ; 96.83,1112.58 cw(c350,1420) 100,1730 ; 604.7,1108 ccw(c354.7,1418) 607.87,1725.42 ; 664.7,1008 ccw(c374.7,1418) 695.39,1804.47 ; 734.7,908 ccw(c364.7,1418) 771.69,1898.99 ; -415,-90 -415,2290 1150,2290 1150,-90 -415,-90
  text "SDA" at 13.46,80 h55.12
  text "SCK" at 113.46,80 h55.12
  text "MOSI" at 213.46,80 h55.12
  text "MISO" at 313.46,80 h55.12
  text "IRQ" at 413.44,78.83 h55.12
  text "GND" at 513.46,80 h55.12
  text "3.3V" at 713.46,80 h55.12
  text "RST" at 613.46,80 h55.12
3D body "HH8X1.stp": height 342.52, standoff -118.11, extent -49.92,-44.21 759.93,54.21

## SIM800L [mm] "GSM MODULE"
pads (12):
  oval 1.65x3 hole 1: 1(0,0) 2(2.54,0) 3(5.08,0) 4(7.62,0) 5(10.16,0) 6(12.7,0) 7(15.24,22) 8(12.7,22) 9(10.033,22) 10(7.493,22) 11(4.953,22) 12(2.413,22)
Top Overlay:
  circle w0.9: c-3.175,0 r0.5
  lines w0.2: -4.826,-1.778 -4.826,24.003 ; -5.334,-1.778 -5.334,24.003 18.415,24.003 18.415,-1.778 -5.334,-1.778
3D body "6-Pin Header - Female - 2.54mm.step": height 5, standoff -3, extent -1.6,-1.163 14.14,1.337
3D body "6-Pin Header - Female - 2.54mm.step": height 5, standoff -3, extent 0.893,20.828 16.633,23.328
3D body "SIM800L.step": height 12.5, standoff 0.46, extent -5.001,-1.451 18.104,23.549

## SIM7600X  Breakout [mm] "SIM7600X 4G Breakout Waveshare"
pads (26):
  oval 2.75x1.75 hole 1.1: 1(0,30.48) 2(0,27.94) 3(0,25.4) 4(0,22.86) 5(0,20.32) 6(0,17.78) 7(0,15.24) 8(0,12.7) 9(0,10.16) 10(0,7.62) 11(0,5.08) 12(0,2.54) 13(0,0) 14(35.56,0) 15(35.56,2.54) 16(35.56,5.08) 17(35.56,7.62) 18(35.56,10.16) 19(35.56,12.7) 20(35.56,15.24) 21(35.56,17.78) 22(35.56,20.32) 23(35.56,22.86) 24(35.56,25.4) 25(35.56,27.94) 26(35.56,30.48)
Top Overlay:
  circle w1: c0.127,38.481 r0.5
  lines w0.2: -1.778,-3.175 37.719,-3.175 37.719,40.132 -1.143,40.132 -1.778,39.497 -1.778,-3.175
Mechanical 15:
  lines w0.127: 1.905,39.878 1.905,-2.921 21.328,-2.921 33.909,-2.921 33.909,39.878
  lines w0.2: 1.905,39.878 33.909,39.878
3D body "61301311821 (rev1).stp": height 8.75, standoff -2.85, extent -1.25,-1.574 1.25,31.946
3D body "61301311121 (rev1).stp": height 14.77, standoff 3.23, extent -1.27,-1.27 1.27,31.75
3D body "61301311121 (rev1).stp": height 14.77, standoff 3.23, extent 34.29,-1.27 36.83,31.75
3D body "sim7600x_4g_module.stp": height 18.82, standoff 9.44, extent -1.58,-2.941 37.211,39.771
3D body "61301311821 (rev1).stp": height 8.75, standoff -2.85, extent 34.31,-1.012 36.81,32.508

## SIP 4 Packaged [mm] "SIP Packaged 4 Pin 2.54mm"
pads (4):
  round 1.4 hole 0.8: 1(0,0) 2(2.54,0) 3(5.08,0) 4(7.62,0)
Top Overlay:
  circle w0.2: c-1.905,-3.937 r0.254
  lines w0.2: -2.54,-3.302 -2.54,2.667 -1.524,2.667 10.16,2.667 10.16,-3.302 -2.54,-3.302
3D body "ASAIR DHT20 SIP .step": height 16.34, standoff -7.53, extent -2.465,-3.165 10.085,2.54